# Altium footprint library d1_PcbLib.PcbLib: 266 footprints (part 1 of 17)
Each footprint in its own frame and in the unit in brackets; x right, y up, seen from the top. Pads: shape width x height; smd on the part's side, far side on the other; paste and mask are expansions set on the pad; w line width, h text height; cw(c..) or ccw(c..) is an arc to the next point about the centre after c.
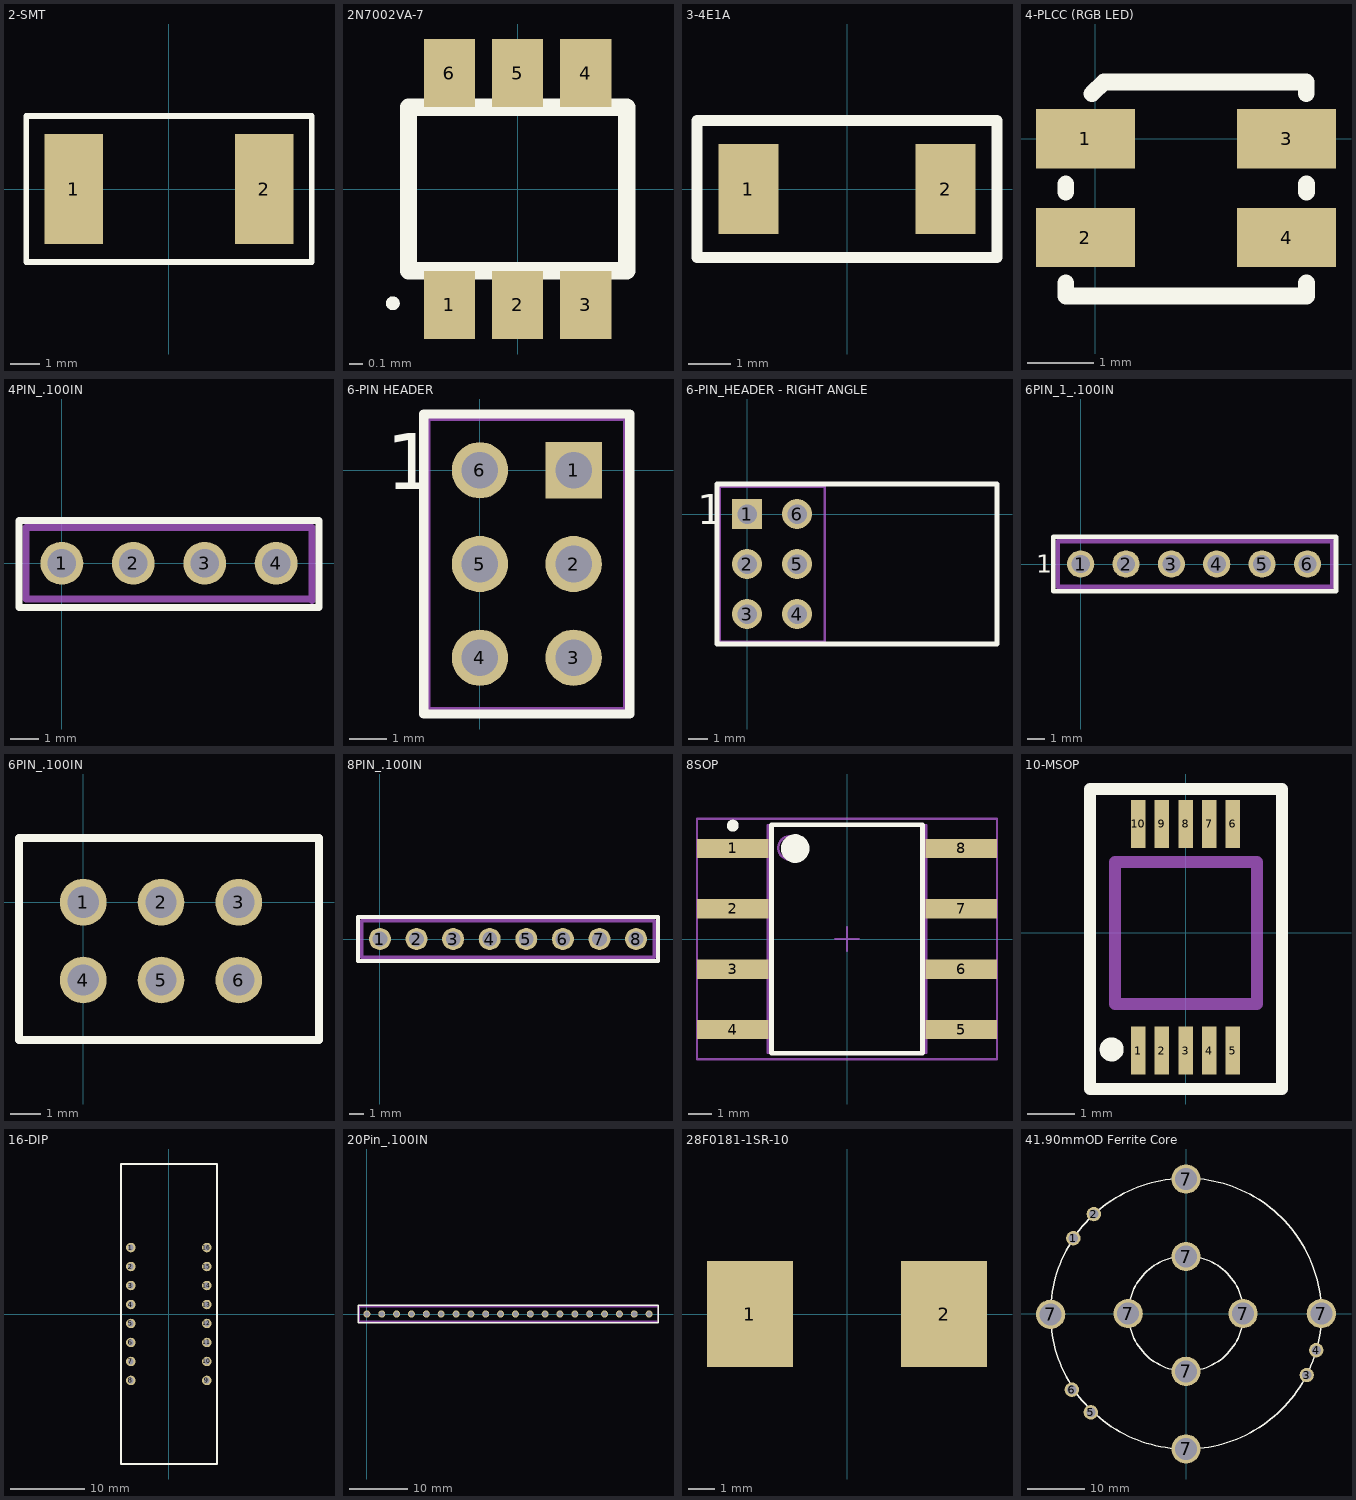
[diagram p0: the footprints below, top view; thin cyan lines are the x and y axes]

## 2-SMT [mm] "2mm X 3.75mm X 2 FUSE"
pads (2):
  rect 2x3.75 smd: 1(-3.25,0) 2(3.25,0)
Top Overlay:
  lines w0.2: -4.875,-2.5 -4.875,0 -4.875,2.5 4.875,2.5 4.875,-2.5 -4.875,-2.5

## 2N7002VA-7 [mm] "MOSFET 2N-CH 60V 280MA SOT-563"
pads (6):
  rect 0.375x0.5 smd mask+0.062: 1(-0.5,-0.85) 2(0,-0.85) 3(0.5,-0.85) 4(0.5,0.85) 5(0,0.85) 6(-0.5,0.85)
Top Overlay:
  circle w0.051: c-0.914,-0.838 r0.025
  lines w0.127: -0.8,-0.6 -0.8,0.6 0.8,0.6 0.8,-0.6 -0.8,-0.6
3D body: height 0.6, standoff 0, extent -0.8,-0.59 0.8,0.61

## 3-4E1A [mm]
pads (2):
  rect 1.4x2.1 smd: 1(-2.3,0) 2(2.3,0)
Top Overlay:
  lines w0.254: -3.5,-1.6 -3.5,1.6 3.5,1.6 3.5,-1.6 -3.5,-1.6
3D body: height 0.98, standoff 0, extent -4.054,-1.638 -0.254,0.762
3D body: height 0.16, standoff 0, extent -2.325,-0.875 -1.675,0.875
3D body: height 0.16, standoff 0, extent 1.675,-0.875 2.325,0.875

## 4-PLCC (RGB LED) [mm]
height 1.9
pads (4):
  rect 1.5x0.9 smd: 1(-0.152,0) 2(-0.152,-1.5) 3(2.902,0) 4(2.902,-1.5)
Top Overlay:
  lines w0.254: -0.452,-2.184 -0.452,-2.388 3.2,-2.388 ; -0.452,-0.813 -0.452,-0.686 ; -0.051,0.686 0.127,0.864 3.2,0.864 3.2,0.686 ; 3.206,-2.388 3.206,-2.184 ; 3.206,-0.813 3.206,-0.686
3D body: height 1.91, standoff 0, extent -0.33,-2.108 3.124,0.686

## 4PIN_.100IN [mil]
pads (4):
  round 60 hole 40.16: 1(0,0) 2(100,0) 3(200,0) 4(300,0)
Top Overlay:
  lines w10: -60,-62 360,-62 360,58 ; -60,-60 -60,60 360,60
Mechanical 13:
  lines w10: 350,-52 350,48 ; 350,-50 -50,-50 -50,50 350,50
3D body: height 335, standoff 0, extent -49.98,-50 350.02,50

## 6-PIN HEADER [mil]
pads (6):
  rect 60x60 hole 39: 1(100,0)
  round 60 hole 39: 2(100,-100) 3(100,-200) 4(0,-200) 5(0,-100) 6(0,0)
Top Overlay:
  lines w10: -60,-260 -60,60 160,60 160,-260 -60,-260
  text "1" at -100,-20 h60
Mechanical 13:
  lines w5: -55,-255 -55,55 155,55 155,-255 -55,-255 ; -12.5,-212.5 12.5,-212.5 12.5,-187.5 -12.5,-187.5 -12.5,-212.5 ; -12.5,-112.5 12.5,-112.5 12.5,-87.5 -12.5,-87.5 -12.5,-112.5 ; -12.5,-12.5 12.5,-12.5 12.5,12.5 -12.5,12.5 -12.5,-12.5 ; 87.5,-212.5 112.5,-212.5 112.5,-187.5 87.5,-187.5 87.5,-212.5 ; 87.5,-112.5 112.5,-112.5 112.5,-87.5 87.5,-87.5 87.5,-112.5 ; 87.5,-12.5 87.5,12.5 112.5,12.5 112.5,-12.5 87.5,-12.5

## 6-PIN_HEADER - RIGHT ANGLE [mil]
pads (6):
  rect 60x60 hole 39: 1(0,0)
  round 60 hole 39: 2(0,-100) 3(0,-200) 4(100,-200) 5(100,-100) 6(100,0)
Top Overlay:
  lines w10: -60,-260 500,-260 500,60 -60,60 -60,-260
  text "1" at -100,-20 h60
Mechanical 13:
  lines w5: -55,-255 155,-255 155,55 -55,55 -55,-255 ; -12.5,-212.5 -12.5,-187.5 12.5,-187.5 12.5,-212.5 -12.5,-212.5 ; -12.5,-112.5 -12.5,-87.5 12.5,-87.5 12.5,-112.5 -12.5,-112.5 ; -12.5,-12.5 -12.5,12.5 12.5,12.5 12.5,-12.5 -12.5,-12.5 ; 87.5,-212.5 87.5,-187.5 112.5,-187.5 112.5,-212.5 87.5,-212.5 ; 87.5,-112.5 87.5,-87.5 112.5,-87.5 112.5,-112.5 87.5,-112.5 ; 87.5,-12.5 112.5,-12.5 112.5,12.5 87.5,12.5 87.5,-12.5
3D body: height 221, standoff -588, extent -12.5,-249.99 490,50.01

## 6PIN_1_.100IN [mil]
pads (6):
  round 60 hole 40.16: 1(0,0) 2(100,0) 3(200,0) 4(300,0) 5(400,0) 6(500,0)
Top Overlay:
  lines w10: -60,-60 562.99,-60 562.99,60 -60,60 -60,-60
  text "1" at -98.43,-19.68 h40
Mechanical 13:
  lines w10: -50,-50 555.12,-50 555.12,50 -50,50 -50,-50

## 6PIN_.100IN [mil]
pads (6):
  round 60 hole 40.16: 1(0,0) 2(100,0) 3(200,0) 4(0,-100) 5(100,-100) 6(200,-100)
Top Overlay:
  lines w10: -82.68,-177.17 303.15,-177.17 303.15,82.68 -82.68,82.68 -82.68,-177.17

## 8PIN_.100IN [mil]
pads (8):
  round 60 hole 40.16: 1(0,0) 2(100,0) 3(200,0) 4(300,0) 5(400,0) 6(500,0) 7(600,0) 8(700,0)
Top Overlay:
  lines w10: -60,-60 -60,60 760,60 760,-60 -60,-60
Mechanical 13:
  lines w10: -50,-50 -50,50 750,50 750,-50 -50,-50
3D body: height 335, standoff 0, extent -49.98,-49.98 750.02,50.02

## 8SOP [mm]
height 4.85
pads (8):
  rect 3x0.8 smd: 1(-4.8,3.81) 2(-4.8,1.27) 3(-4.8,-1.27) 4(-4.8,-3.81) 5(4.8,-3.81) 6(4.8,-1.27) 7(4.8,1.27) 8(4.8,3.81)
Top Overlay:
  circle w0.25: c-4.8,4.76 r0.125
  circle w0.6: c-2.175,3.8 r0.3
  lines w0.2: -3.175,-4.8 -3.175,4.8 3.175,4.8 3.175,-4.8 -3.175,-4.8
Mechanical 13:
  circle w0.1: c-2.385,3.825 r0.5
  lines w0.1: -3.335,-4.775 -3.335,4.775 3.335,4.775 3.335,-4.775 -3.335,-4.775
Mechanical 15:
  lines w0.1: -0.5,0 0.5,0 ; 0,-0.5 0,0.5 ; -6.3,-5.05 -6.3,5.05 6.3,5.05 6.3,-5.05 -6.3,-5.05
3D body: height 4.85, standoff 0.2, extent -3.335,-4.775 3.335,4.775

## 10-MSOP [mil]
pads (10):
  rect 12x40 smd: 1(-39.74,-98) 2(-20.05,-98) 3(-0.37,-98) 4(19.32,-98) 5(39,-98) 6(39,91) 7(19.32,91) 8(-0.37,91) 9(-20.05,91) 10(-39.74,91)
Top Overlay:
  circle w10: c-62,-97 r5
  lines w10: -80,-130 -80,120 80,120 80,-130 -80,-130
Mechanical 1:
  lines w10: -59,-59 59,-59 59,59 -59,59 -59,-59
3D body: height 34, standoff 6, extent -59,-59 59,59

## 16-DIP [mil]
pads (16):
  round 50 hole 30: 1(-200,350) 2(-200,250) 3(-200,150) 4(-200,50) 5(-200,-50) 6(-200,-150) 7(-200,-250) 8(-200,-350) 9(200,-350) 10(200,-250) 11(200,-150) 12(200,-50) 13(200,50) 14(200,150) 15(200,250) 16(200,350)
Top Overlay:
  lines w10: -251,-790 -251,790 -143,790 145,790 253,790 253,-790 -251,-790
3D body: height 275.59, standoff -133.86, extent -251.97,-790 251.97,791.89

## 20Pin_.100IN [mm]
pads (20):
  round 1.2 hole 0.88: 1(0,0) 2(2.54,0) 3(5.08,0) 4(7.62,0) 5(10.16,0) 6(12.7,0) 7(15.24,0) 8(17.78,0) 9(20.32,0) 10(22.86,0) 11(25.4,0) 12(27.94,0) 13(30.48,0) 14(33.02,0) 15(35.56,0) 16(38.1,0) 17(40.64,0) 18(43.18,0) 19(45.72,0) 20(48.26,0)
Top Overlay:
  lines w0.254: -1.524,-1.524 -1.524,1.524 49.784,1.524 49.784,-1.524 -1.524,-1.524
Mechanical 13:
  lines w0.254: -1.27,-1.27 -1.27,1.27 49.784,1.27 49.784,-1.27 -1.27,-1.27

## 28F0181-1SR-10 [mil]
pads (2):
  rect 130x160 smd: 1(-146.5,0) 2(146.5,0)

## 41.90mmOD Ferrite Core [mm]
height 19.05
pads (14):
  round 2.5 hole 1.6: 1(-19.558,13.081) 2(-16.002,17.272) 3(20.955,-10.668) 4(22.606,-6.35) 5(-16.51,-17.145) 6(-19.812,-13.208)
  round 5.08 hole 3.81: 7(-23.495,-0.127) 7(-10.033,0) 7(0,-23.495) 7(0,-10.033) 7(0,9.906) 7(0,23.348) 7(9.906,0) 7(23.495,0)
Top Overlay:
  circle w0.254: c0,0 r10
  circle w0.254: c0,0 r23.5
3D body: height 15.5, standoff 0, extent -21.827,-21.957 22,21.957